# Altium footprint library Atlan.PcbLib: 283 footprints (part 16 of 18)
Each footprint in its own frame and in the unit in brackets; x right, y up, seen from the top. Pads: shape width x height; smd on the part's side, far side on the other; paste and mask are expansions set on the pad; w line width, h text height; cw(c..) or ccw(c..) is an arc to the next point about the centre after c.
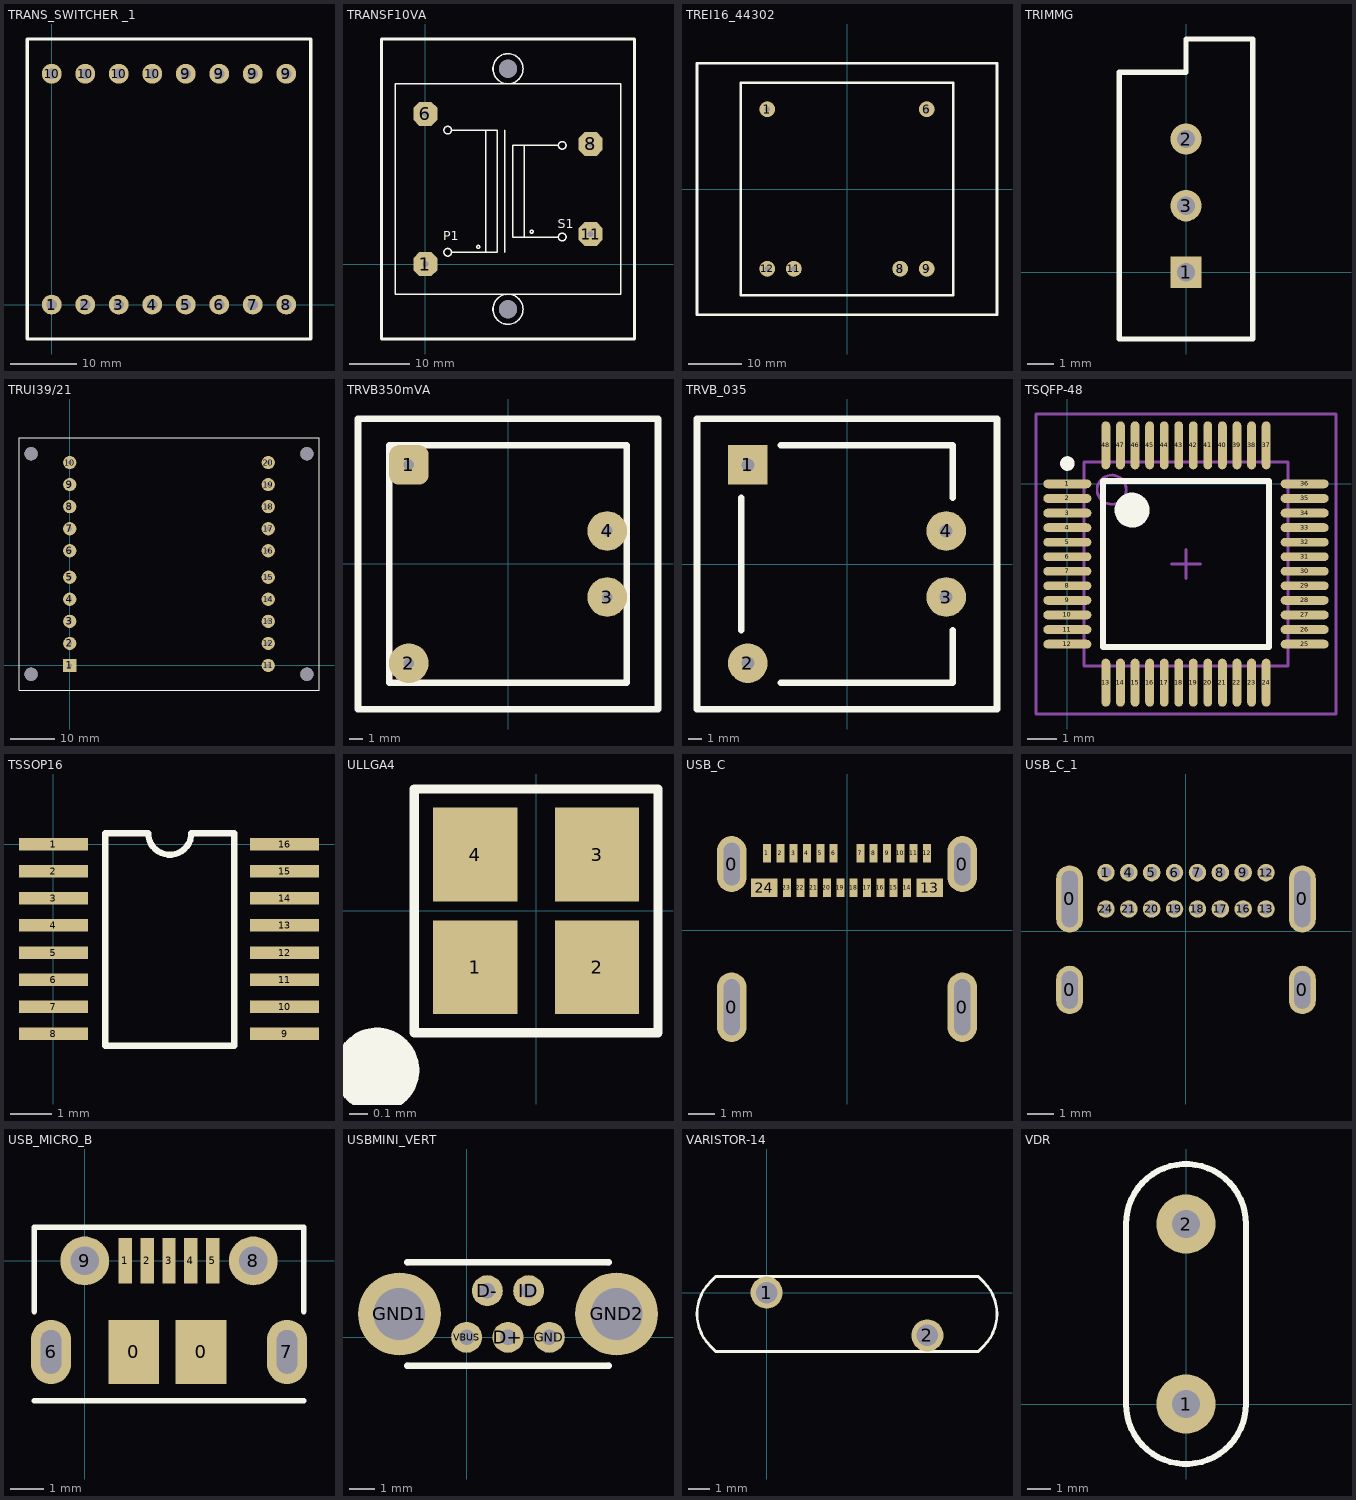
[diagram p15: the footprints below, top view; thin cyan lines are the x and y axes]

## TRANS_SWITCHER _1 [mm]
pads (16):
  round 3 hole 1.6: 1(0,0) 2(5.08,0) 3(10.16,0) 4(15.24,0) 5(20.32,0) 6(25.4,0) 7(30.48,0) 8(35.56,0) 9(20.32,35) 9(25.4,35) 9(30.48,35) 9(35.56,35) 10(0,35) 10(5.08,35) 10(10.16,35) 10(15.24,35)
Top Overlay:
  lines w0.5: -3.683,-5.207 39.243,-5.207 39.243,40.259 -3.683,40.259 -3.683,-5.207

## TRANSF10VA [mm]
pads (6):
  oct 4x4 hole 1: 1(0,0) 6(0,25) 8(27.5,20) 11(27.5,5)
  round 3 hole 3 unplated: ""(13.75,-7.5) ""(13.75,32.5)
Top Overlay:
  drawing of 289 lines, arcs and shapes, not listed
  text "S1" at 22,6 h1.52
  text "P1" at 3,4 h1.52

## TREI16_44302 [mm]
pads (6):
  round 3 hole 1: 1(-15,15) 6(15,15) 8(10,-15) 9(15,-15) 11(-10,-15) 12(-15,-15)
Top Overlay:
  lines w0.5: -28.2,-23.65 -28.2,23.65 28.2,23.65 28.2,-23.65 -28.2,-23.65 ; -20,-20 20,-20 20,20 -20,20 -20,-20
3D body "TREI16_44302.STEP": height 38, standoff -3, extent -28,-23.65 28.4,23.65

## TRIMMG [mm] "TrimerPot"
pads (3):
  rect 1.2x1.2 hole 0.7: 1(0,0)
  round 1.2 hole 0.7: 2(0,5.08) 3(0,2.54)
Top Overlay:
  lines w0.2: -2.54,-2.54 2.54,-2.54 2.54,8.89 0,8.89 0,7.62 -2.54,7.62 -2.54,-2.54

## TRUI39/21 [mm] "Transformer"
pads (24):
  rect 3x3 hole 1: 1(0,0)
  round 3 hole 1: 2(0,5) 3(0,10) 4(0,15) 5(0,20) 6(0,26) 7(0,31) 8(0,36) 9(0,41) 10(0,46) 11(45,0) 12(45,5) 13(45,10) 14(45,15) 15(45,20) 16(45,26) 17(45,31) 18(45,36) 19(45,41) 20(45,46)
  round 3 hole 3 unplated: ""(-8.75,-2) ""(-8.75,48) ""(53.75,-2) ""(53.75,48)
Top Overlay:
  lines w0.2: -11.5,-5.6 -11.5,51.6 56.5,51.6 56.5,-5.6 -11.5,-5.6
3D body: height 35, standoff 0, extent -11.5,-5.6 56.5,51.6

## TRVB350mVA [mm]
pads (4):
  rrect50% 3x3 hole 0.8: 1(-7.5,7.5)
  round 3 hole 0.8: 2(-7.5,-7.5) 3(7.5,-2.5) 4(7.5,2.5)
Top Overlay:
  lines w0.5: -11.35,-11 11.35,-11 11.35,11 -11.35,11 -11.35,-11 ; -9,-9 9,-9 9,9 -9,9 -9,-9
3D body "TR350mAV.STEP": height 15, standoff -4.7, extent -11.35,-10.92 11.25,10.78

## TRVB_035 [mm]
pads (4):
  rect 3x3 hole 1: 1(-7.5,7.5)
  round 3 hole 1: 2(-7.5,-7.5) 3(7.5,-2.5) 4(7.5,2.5)
Top Overlay:
  lines w0.5: -8,-5 -8,5 ; -5,-9 8,-9 8,-5 ; -5,9 8,9 8,5 ; -11.35,-11 -11.35,11 11.35,11 11.35,-11 -11.35,-11
3D body "TRVB_035.STEP": height 15, standoff -3, extent -11.35,-11 11.35,11

## TSQFP-48 [mm] "TSQFP, 48-Leads, Body 9,0x9,0mm (max), Pitch 0,50mm, IPC Medium Density"
height 1.2
pads (48):
  oval 1.65x0.3 smd: 1(0,0) 2(0,-0.5) 3(0,-1) 4(0,-1.5) 5(0,-2) 6(0,-2.5) 7(0,-3) 8(0,-3.5) 9(0,-4) 10(0,-4.5) 11(0,-5) 12(0,-5.5) 25(8.15,-5.5) 26(8.15,-5) 27(8.15,-4.5) 28(8.15,-4) 29(8.15,-3.5) 30(8.15,-3) 31(8.15,-2.5) 32(8.15,-2) 33(8.15,-1.5) 34(8.15,-1) 35(8.15,-0.5) 36(8.15,0)
  oval 0.3x1.65 smd: 13(1.325,-6.825) 14(1.825,-6.825) 15(2.325,-6.825) 16(2.825,-6.825) 17(3.325,-6.825) 18(3.825,-6.825) 19(4.325,-6.825) 20(4.825,-6.825) 21(5.325,-6.825) 22(5.825,-6.825) 23(6.325,-6.825) 24(6.825,-6.825) 37(6.825,1.325) 38(6.325,1.325) 39(5.825,1.325) 40(5.325,1.325) 41(4.825,1.325) 42(4.325,1.325) 43(3.825,1.325) 44(3.325,1.325) 45(2.825,1.325) 46(2.325,1.325) 47(1.825,1.325) 48(1.325,1.325)
Top Overlay:
  circle w0.25: c0,0.7 r0.125
  circle w0.6: c2.225,-0.9 r0.3
  lines w0.2: 1.225,-5.6 1.225,0.1 6.925,0.1 6.925,-5.6 1.225,-5.6
Mechanical 13:
  circle w0.1: c1.525,-0.2 r0.5
  lines w0.1: 0.575,-6.25 0.575,0.75 7.575,0.75 7.575,-6.25 0.575,-6.25
Mechanical 15:
  lines w0.1: 3.575,-2.75 4.575,-2.75 ; 4.075,-3.25 4.075,-2.25 ; -1.075,-7.9 -1.075,2.4 9.225,2.4 9.225,-7.9 -1.075,-7.9
3D body: height 1.2, standoff 0.08, extent 0.575,-6.25 7.575,0.75

## TSSOP16 [mm]
pads (16):
  rect 1.651x0.3 smd: 1(0,0) 2(0,-0.65) 3(0,-1.3) 4(0,-1.95) 5(0,-2.6) 6(0,-3.25) 7(0,-3.9) 8(0,-4.55) 9(5.55,-4.55) 10(5.55,-3.9) 11(5.55,-3.25) 12(5.55,-2.6) 13(5.55,-1.95) 14(5.55,-1.3) 15(5.55,-0.65) 16(5.55,0)
Top Overlay:
  lines w0.15: 1.244,-4.836 1.244,0.264 2.277,0.264 ccw(c2.794,0.264) 3.311,0.264 4.344,0.264 4.344,-4.836 1.244,-4.836

## ULLGA4 [mm]
height 0.45
pads (4):
  rect 0.45x0.5 smd: 1(-0.325,-0.3) 2(0.325,-0.3) 3(0.325,0.3) 4(-0.325,0.3)
Top Overlay:
  circle w0.254: c-0.85,-0.85 r0.1
  lines w0.05: -0.65,-0.65 -0.65,-0.55 -0.65,0.55 -0.65,0.65 -0.55,0.65 0.55,0.65 0.65,0.65 0.65,0.55 0.65,-0.55 0.65,-0.65 0.55,-0.65 -0.55,-0.65 -0.65,-0.65
3D body: height 0.65, standoff 0, extent -0.6,-0.6 0.6,0.6

## USB_C [mm]
pads (28):
  oval 1.1x2.6 hole 0.6 slot 2.1 at 90 deg unplated mask+0.04: 0(-4.32,-2.885) 0(4.32,-2.885)
  oval 1.1x2.1 hole 0.6 slot 1.6 at 90 deg unplated mask+0.04: 0(-4.32,2.475) 0(4.32,2.475)
  rect 0.3x0.7 smd mask+0.04: 1(-3,2.885) 2(-2.5,2.885) 3(-2,2.885) 4(-1.5,2.885) 5(-1,2.885) 6(-0.5,2.885) 7(0.5,2.885) 8(1,2.885) 9(1.5,2.885) 10(2,2.885) 11(2.5,2.885) 12(3,2.885) 14(2.25,1.585) 15(1.75,1.585) 16(1.25,1.585) 17(0.75,1.585) 18(0.25,1.585) 19(-0.25,1.585) 20(-0.75,1.585) 21(-1.25,1.585) 22(-1.75,1.585) 23(-2.25,1.585)
  rect 1x0.7 smd mask+0.04: 13(3.1,1.585) 24(-3.1,1.585)
3D body "UsbC.STEP": height 3.23, standoff -1.01, extent -4.47,-4.9 4.47,3

## USB_C_1 [mm]
pads (20):
  oval 1x1.8 hole 0.6 slot 1.4 at 90 deg mask+0.04: 0(-4.325,-2.18) 0(4.325,-2.18)
  oval 1x2.5 hole 0.6 slot 2.1 at 90 deg mask+0.04: 0(-4.325,1.2) 0(4.325,1.2)
  round 0.65 hole 0.4 mask+0.02: 1(-2.975,2.18) 4(-2.125,2.18) 5(-1.275,2.18) 6(-0.425,2.18) 7(0.425,2.18) 8(1.275,2.18) 9(2.125,2.18) 12(2.975,2.18) 13(2.975,0.83) 16(2.125,0.83) 17(1.275,0.83) 18(0.425,0.83) 19(-0.425,0.83) 20(-1.275,0.83) 21(-2.125,0.83) 24(-2.975,0.83)
3D body "UsbCLong.STEP": height 3.27, standoff -0.97, extent -4.5,-6.4 4.44,2.77

## USB_MICRO_B [mm] "part num: 105017-0001.."
height 2.9
pads (11):
  rect 1.5x1.9 smd: 0(1.45,-2.7) 0(3.45,-2.7)
  rect 0.4x1.35 smd: 1(1.2,0) 2(1.85,0) 3(2.5,0) 4(3.15,0) 5(3.8,0)
  oval 1.2x1.9 hole 0.6 slot 1.3 at 90 deg: 6(-1,-2.7) 7(6,-2.7)
  round 1.45 hole 0.85: 8(5,0) 9(0,0)
Top Overlay:
  lines w0.17: -1.5,-4.15 6.5,-4.15 ; -1.5,-1.5 -1.5,1 6.5,1 6.5,-1.5
3D body "1050170001.stp": height 2.78, standoff -0.53, extent -1.6,-5.25 6.6,0.15

## USBMINI_VERT [mm]
pads (15):
  round 0.254 on Mech1: 1(-2.3,-1.1) 1(-2.3,-1.1) 1(-2.3,2.9) 1(-2.3,2.9) 1(5.5,-1.1) 1(5.5,-1.1) 1(5.5,2.9) 1(5.5,2.9)
  round 1.199 hole 0.599: D+(1.6,0) D-(0.8,1.8) GND(3.2,0) ID(2.4,1.8) VBUS(0,0)
  round 3.2 hole 1.999: GND1(-2.6,0.9) GND2(5.8,0.9)
Top Overlay:
  lines w0.254: -2.3,-1.1 5.5,-1.1 ; -2.3,2.9 5.5,2.9

## VARISTOR-14 [mm]
pads (2):
  round 1.5 hole 1: 1(0,0) 2(7.5,-2)
Top Overlay:
  lines w0.127: -3.25,-1 ccw(c-1.138,-1) -2.631,-2.494 -2.375,-2.75 9.875,-2.75 10.131,-2.494 ccw(c8.638,-1) 10.75,-1 ccw(c8.638,-1) 10.131,0.494 9.875,0.75 -2.375,0.75 -2.631,0.494 ccw(c-1.138,-1) -3.25,-1

## VDR [mm] "Varistor"
pads (2):
  round 2.5 hole 1.2: 1(0,0) 2(0,7.62)
Top Overlay:
  lines w0.254: -2.54,0 ccw(c0,0) 2.54,0 2.54,7.62 ccw(c0,7.62) -2.54,7.62 -2.54,0